# Altium footprint library Airscout_PCB_Lib.PcbLib: 44 footprints (part 1 of 3)
Each footprint in its own frame and in the unit in brackets; x right, y up, seen from the top. Pads: shape width x height; smd on the part's side, far side on the other; paste and mask are expansions set on the pad; w line width, h text height; cw(c..) or ccw(c..) is an arc to the next point about the centre after c.
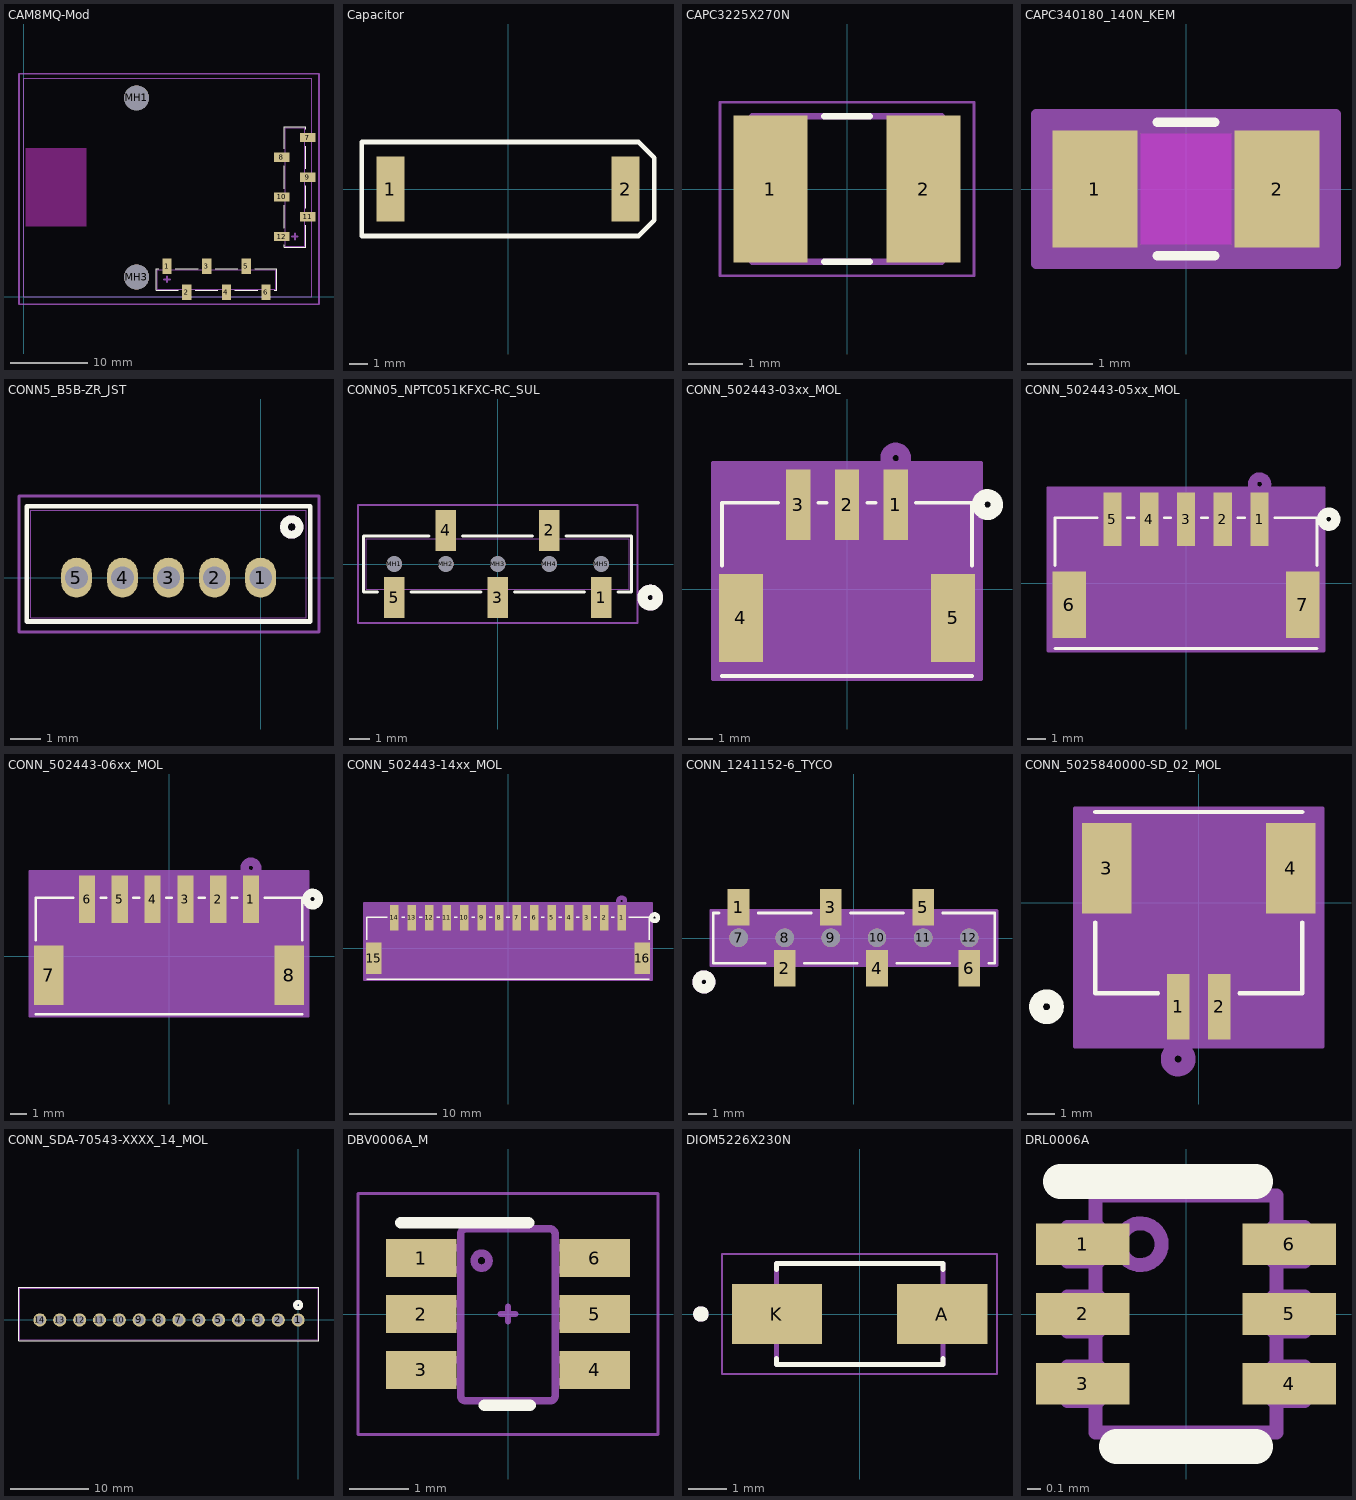
[diagram p0: the footprints below, top view; thin cyan lines are the x and y axes]

## CAM8MQ-Mod [mm] "For SMD Soldering"
pads (14):
  rect 1.2x2 smd paste+0 mask+0.025: 1(18.4,3.876) 2(20.94,0.524) 3(23.48,3.876) 4(26.02,0.524) 5(28.56,3.876) 6(31.1,0.524)
  rect 2x1.2 smd paste+0 mask+0.025: 7(36.476,20.4) 8(33.124,17.86) 9(36.476,15.32) 10(33.124,12.78) 11(36.476,10.24) 12(33.124,7.7)
  round 3.2 hole 3.2 unplated: MH1(14.5,25.5) MH3(14.5,2.5)
Top Layer keep-out:
  region: 0.25,19 8,19 8,9 0.25,9
Top Overlay:
  lines w0.152: 17.318,3.572 17.003,3.572 17.003,0.803 19.858,0.803 ; 19.482,3.572 22.398,3.572 ; 22.022,0.803 24.938,0.803 ; 24.562,3.572 27.478,3.572 ; 27.102,0.803 30.018,0.803 ; 29.642,3.572 32.497,3.572 32.497,0.803 32.182,0.803 ; 33.428,6.618 33.428,6.303 36.197,6.303 36.197,9.158 ; 33.428,8.782 33.428,11.698 ; 33.428,13.862 33.428,16.778 ; 33.428,18.942 33.428,21.797 36.197,21.797 36.197,21.482 ; 36.197,11.322 36.197,14.238 ; 36.197,16.402 36.197,19.318
Mechanical 3:
  text "GPS-Module" at 12.154,14.254 h1.52
Mechanical 7:
  lines w0.254: 18.035,2.2 18.765,2.2 ; 18.4,1.835 18.4,2.565 ; 34.435,7.7 35.165,7.7 ; 34.8,7.335 34.8,8.065
Mechanical 13:
  lines w0.025: 17.13,0.93 17.13,3.445 32.37,3.445 32.37,0.93 17.13,0.93 ; 33.555,6.43 36.07,6.43 36.07,21.67 33.555,21.67 33.555,6.43
  lines w0.1: 32.004,0 37,0 37,21.8 ; 33.3,0 0,0 0,28 37,28 37,21.5
Mechanical 15:
  lines w0.2: -0.6,-1 37.9,-1 37.9,28.6 -0.6,28.6 -0.6,-1
3D body "NPTC061KFXC-RC.STEP": height 7.49, standoff 0, extent 32.793,6.43 37.086,21.67
3D body "NPTC061KFXC-RC.STEP": height 7.49, standoff 0, extent 17.13,-0.086 32.37,4.207

## Capacitor [mm]
pads (2):
  rect 1.5x3.5 smd: 1(-6.35,0) 2(6.35,0)
Top Overlay:
  lines w0.254: -7.89,-2.54 7.043,-2.54 7.89,-1.693 7.89,1.693 7.043,2.54 -7.89,2.54 -7.89,0 -7.89,-2.54

## CAPC3225X270N [mm] "CAP 1210 Imperial"
pads (2):
  rect 1.37x2.72 smd: 1(-1.421,0) 2(1.421,0)
Top Overlay:
  lines w0.127: -0.42,-1.35 0.42,-1.35 ; -0.42,1.35 0.42,1.35
Mechanical 13:
  lines w0.127: -1.75,-1.35 -1.75,1.35 1.75,1.35 1.75,-1.35 -1.75,-1.35
Mechanical 15:
  lines w0.05: -2.355,-1.608 -2.355,1.608 2.355,1.608 2.355,-1.608 -2.355,-1.608
3D body "step_temp.STEP": height 2.7, standoff 0, extent -1.6,-1.25 1.6,1.25

## CAPC340180_140N_KEM [mm] "Caseform: 1206 Imperial; for Caps"
pads (2):
  rect 1.306x1.8 smd paste+0 mask+0: 1(-1.403,0) 2(1.403,0)
Top Layer keep-out:
  region: -0.699,-0.849 -0.699,0.849 0.699,0.849 0.699,-0.849
Top Overlay:
  lines w0.152: -0.442,-1.027 0.442,-1.027 ; -0.442,1.027 0.442,1.027
Mechanical 13:
  lines w0.025: -1.7,-0.9 -1.7,0.9 ; -1.7,-0.9 -0.95,-0.9 -0.95,0.9 -1.7,0.9 ; -1.7,-0.9 1.7,-0.9 ; -1.7,-0.9 -1.7,0.9 ; -1.7,0.9 1.7,0.9 ; 1.7,-0.9 0.95,-0.9 0.95,0.9 1.7,0.9 ; 1.7,-0.9 1.7,0.9 ; 1.7,-0.9 1.7,0.9
Mechanical 15:
  region: 2.31,-1.154 -2.31,-1.154 -2.31,1.154 2.31,1.154
  lines w0.152: -2.31,-1.154 -2.31,1.154 2.31,1.154 2.31,-1.154 -2.31,-1.154
3D body "CAPC340180_140N_KEM.step": height 1.4, standoff 0, extent -1.7,-0.9 1.7,0.9

## CONN5_B5B-ZR_JST [mm]
pads (5):
  oval 1x1.3 hole 0.737 paste-2539.97: 1(0,0) 2(-1.5,0) 3(-3,0) 4(-4.5,0) 5(-6,0)
Top Overlay:
  circle w0.254: c1.016,1.651 r0.254
  lines w0.152: -7.623,-1.432 -7.623,2.327 1.623,2.327 1.623,-1.432 -7.623,-1.432
Bottom Overlay:
  circle w0.254: c1.016,1.651 r0.254
Mechanical 13:
  circle w0.254: c1.016,1.651 r0.254
  lines w0.025: -7.496,-1.305 -7.496,2.2 1.496,2.2 1.496,-1.305 -7.496,-1.305
Mechanical 15:
  lines w0.1: -7.874,-1.778 1.905,-1.778 1.905,2.667 -7.874,2.667 -7.874,-1.778
3D body "B5B-ZR.STEP": height 4.5, standoff -2.7, extent -7.5,-1.242 1.5,2.258

## CONN05_NPTC051KFXC-RC_SUL [mm]
pads (10):
  rect 1x2 smd paste+0 mask+0.025: 1(5.08,-1.65) 2(2.54,1.65) 3(0,-1.65) 4(-2.54,1.65) 5(-5.08,-1.65)
  round 0.762 hole 0.762: MH1(-5.08,0) MH2(-2.54,0) MH3(0,0) MH4(2.54,0) MH5(5.08,0)
Top Overlay:
  circle w0.508: c7.493,-1.651 r0.381
  lines w0.152: -5.908,-1.372 -6.579,-1.372 -6.579,1.372 -3.368,1.372 ; -4.252,-1.372 -0.828,-1.372 ; -1.712,1.372 1.712,1.372 ; 0.828,-1.372 4.252,-1.372 ; 3.368,1.372 6.579,1.372 6.579,-1.372 5.908,-1.372
Bottom Overlay:
  circle w0.508: c7.493,-1.651 r0.381
Mechanical 13:
  circle w0.508: c7.493,-1.651 r0.381
  lines w0.025: -6.452,-1.245 -6.452,1.245 6.452,1.245 6.452,-1.245 -6.452,-1.245
Mechanical 15:
  lines w0.1: -6.858,-2.907 6.858,-2.907 6.858,2.907 -6.858,2.907 -6.858,-2.907
3D body "NPTC051KFXC-RC.STEP": height 7.49, standoff 0, extent -6.35,-2.273 6.35,2.019

## CONN_502443-03xx_MOL [mil]
pads (5):
  rect 39x114 smd paste+0 mask+0: 1(78.74,136.97) 2(0,136.97) 3(-78.74,136.97)
  rect 71x142 smd paste-71 mask-71: 4(-171.26,-46.1) 5(171.26,-46.1)
Top Overlay:
  circle w20: c227,136.97 r15
  lines w6: -202,-140 202,-140 ; -202,38 -202,140 -111.34,140 ; -46.14,140 -32.6,140 ; 32.6,140 46.14,140 ; 111.34,140 202,140 202,38
Bottom Overlay:
  circle w20: c227,136.97 r15
Mechanical 13:
  circle w20: c78.74,211.97 r15
  lines w1: -197,-135 197,-135 197,135 -197,135 -197,-135
Mechanical 15:
  region: 216.76,203.97 -216.76,203.97 -216.76,-145 216.76,-145
  lines w6: -216.76,-145 -216.76,203.97 216.76,203.97 216.76,-145 -216.76,-145
3D body "5024430370.stp": height 296.1, standoff 0.83, extent -196.85,-134.92 196.85,168.23

## CONN_502443-05xx_MOL [mil]
pads (7):
  rect 39x114 smd paste+0 mask+0: 1(157.48,136.97) 2(78.74,136.97) 3(0,136.97) 4(-78.74,136.97) 5(-157.48,136.97)
  rect 71x142 smd paste-71 mask-71: 6(-250,-46.1) 7(250,-46.1)
Top Overlay:
  circle w20: c305.5,136.97 r15
  lines w6: -280.5,-140 280.5,-140 ; -280.5,38 -280.5,140 -190.08,140 ; -124.88,140 -111.34,140 ; -46.14,140 -32.6,140 ; 32.6,140 46.14,140 ; 111.34,140 124.88,140 ; 190.08,140 280.5,140 280.5,38
Bottom Overlay:
  circle w20: c305.5,136.97 r15
Mechanical 13:
  circle w20: c157.48,211.97 r15
  lines w1: -275.5,-135 -275.5,135 275.5,135 275.5,-135 -275.5,-135
Mechanical 15:
  region: 295.5,203.97 -295.5,203.97 -295.5,-145 295.5,-145
  lines w6: -295.5,-145 295.5,-145 295.5,203.97 -295.5,203.97 -295.5,-145
3D body "5024430570.stp": height 296.1, standoff 0.83, extent -275.59,-130 275.59,173.15

## CONN_502443-06xx_MOL [mil]
pads (8):
  rect 39x114 smd paste+0 mask+0: 1(196.85,136.97) 2(118.11,136.97) 3(39.37,136.97) 4(-39.37,136.97) 5(-118.11,136.97) 6(-196.85,136.97)
  rect 71x142 smd paste-71 mask-71: 7(-289.37,-46.1) 8(289.37,-46.1)
Top Overlay:
  circle w20: c345,136.97 r15
  lines w6: -320,-140 320,-140 ; -320,38 -320,140 -229.45,140 ; -164.25,140 -150.71,140 ; -85.51,140 -71.97,140 ; -6.77,140 6.77,140 ; 71.97,140 85.51,140 ; 150.71,140 164.25,140 ; 229.45,140 320,140 320,38
Bottom Overlay:
  circle w20: c345,136.97 r15
Mechanical 13:
  circle w20: c196.85,211.97 r15
  lines w1: -315,-135 -315,135 315,135 315,-135 -315,-135
Mechanical 15:
  region: 334.87,203.97 -334.87,203.97 -334.87,-145 334.87,-145
  lines w6: -334.87,-145 334.87,-145 334.87,203.97 -334.87,203.97 -334.87,-145
3D body "5024430670.stp": height 296.1, standoff 0.83, extent -314.96,-130 314.96,173.15

## CONN_502443-14xx_MOL [mil]
pads (16):
  rect 39x114 smd paste+0 mask+0: 1(511.81,136.97) 2(433.07,136.97) 3(354.33,136.97) 4(275.59,136.97) 5(196.85,136.97) 6(118.11,136.97) 7(39.37,136.97) 8(-39.37,136.97) 9(-118.11,136.97) 10(-196.85,136.97) 11(-275.59,136.97) 12(-354.33,136.97) 13(-433.07,136.97) 14(-511.81,136.97)
  rect 71x142 smd paste-71 mask-71: 15(-604.33,-46.1) 16(604.33,-46.1)
Top Overlay:
  circle w20: c660,136.97 r15
  lines w6: -635,-140 635,-140 ; -635,38 -635,140 -544.41,140 ; -479.21,140 -465.67,140 ; -400.47,140 -386.93,140 ; -321.73,140 -308.19,140 ; -242.99,140 -229.45,140 ; -164.25,140 -150.71,140 ; -85.51,140 -71.97,140 ; -6.77,140 6.77,140 ; 71.97,140 85.51,140 ; 150.71,140 164.25,140 ; 229.45,140 242.99,140 ; 308.19,140 321.73,140 ; 386.93,140 400.47,140 ; 465.67,140 479.21,140 ; 544.41,140 635,140 635,38
Bottom Overlay:
  circle w20: c660,136.97 r15
Mechanical 13:
  circle w20: c511.81,211.97 r15
  lines w1: -630,-135 630,-135 630,135 -630,135 -630,-135
Mechanical 15:
  region: 649.83,203.97 -649.83,203.97 -649.83,-145 649.83,-145
  lines w6: -649.83,-145 -649.83,203.97 649.83,203.97 649.83,-145 -649.83,-145
3D body "5024431470.stp": height 296.1, standoff 0.83, extent -629.92,-139.92 629.92,163.23

## CONN_1241152-6_TYCO [mil]
pads (12):
  rect 47.24x78.74 smd paste+0 mask+1: 1(-250,66.5) 2(-150,-65.5) 3(-50,66.5) 4(50,-65.5) 5(150,66.5) 6(250,-65.5)
  round 40 hole 40 paste-99999 mask+0: 7(-250,0.5) 8(-150,0.5) 9(-50,0.5) 10(50,0.5) 11(150,0.5) 12(250,0.5)
Top Overlay:
  circle w20: c-325,-95 r15
  lines w6: -292.6,54.5 -305,54.5 -305,-54.5 -192.6,-54.5 ; -207.4,54.5 -92.6,54.5 ; -107.4,-54.5 7.4,-54.5 ; -7.4,54.5 107.4,54.5 ; 92.6,-54.5 207.4,-54.5 ; 192.6,54.5 305,54.5 305,-54.5 292.6,-54.5
Bottom Overlay:
  circle w20: c-325,-95 r15
Mechanical 13:
  circle w20: c-325,-95 r15
  lines w1: -300,-49.5 -300,49.5 300,49.5 300,-49.5 -300,-49.5
Mechanical 15:
  region: 310,59.5 -310,59.5 -310,-59.5 310,-59.5
  lines w6: -310,-59.5 310,-59.5 310,59.5 -310,59.5 -310,-59.5
3D body "NPTC061KFXC-RC.STEP": height 295, standoff 0, extent -300,-89.5 300,79.5

## CONN_5025840000-SD_02_MOL [mil]
pads (4):
  rect 32x94 smd paste+0 mask+0: 1(-29.53,-149.41) 2(29.53,-149.41)
  rect 71x130 smd paste-65 mask-65: 3(-131.89,49.41) 4(131.89,49.41)
Top Overlay:
  circle w20: c-218.5,-149.41 r15
  lines w6: -148.5,-28.69 -148.5,-130 -58.63,-130 ; -148.5,130 148.5,130 ; 58.63,-130 148.5,-130 148.5,-28.69
Bottom Overlay:
  circle w20: c-218.5,-149.41 r15
Mechanical 13:
  circle w20: c-29.53,-224.41 r15
  lines w1: -143.5,-125 143.5,-125 143.5,125 -143.5,125 -143.5,-125
Mechanical 15:
  region: 177.39,135 -177.39,135 -177.39,-206.41 177.39,-206.41
  lines w6: -177.39,-206.41 -177.39,135 177.39,135 177.39,-206.41 -177.39,-206.41
3D body "5025840260.stp": height 285.2, standoff -2.2, extent -142.4,-175.2 145,125.2

## CONN_SDA-70543-XXXX_14_MOL [mil] "0705430013"
pads (14):
  round 66 hole 46: 1(0,0) 2(-100,0) 3(-200,0) 4(-300,0) 5(-400,0) 6(-500,0) 7(-600,0) 8(-700,0) 9(-800,0) 10(-900,0) 11(-1000,0) 12(-1100,0) 13(-1200,0) 14(-1300,0)
Top Overlay:
  lines w6: -1405,-105 -1405,165 105,165 105,-105 -1405,-105
  lines w20: -15,74.8 cw(c0,74.8) 15,74.8 cw(c0,74.8) -15,74.8
Mechanical 13:
  lines w6: -1400,-100 -1400,160 100,160 100,-100 -1400,-100
  lines w20: -15,75 cw(c0,75) 15,75 cw(c0,75) -15,75
3D body "705430013.stp": height 450, standoff -145, extent -1400,-100 100,160

## DBV0006A_M [mm]
pads (6):
  rect 1.2x0.65 smd paste+0 mask+0.051: 1(-1.475,0.95) 2(-1.475,0) 3(-1.475,-0.95) 4(1.475,-0.95) 5(1.475,0) 6(1.475,0.95)
Top Overlay:
  lines w0.2: -1.825,1.55 0.35,1.55 ; -0.4,-1.55 0.375,-1.55
Mechanical 13:
  lines w0.127: 0.724,-1.475 ccw(c0.723,-1.399) 0.8,-1.399 0.8,1.37 ccw(c0.723,1.37) 0.724,1.446 ; 0.723,-1.475 -0.724,-1.475 -0.725,-1.475 cw(c-0.724,-1.399) -0.801,-1.399 -0.801,1.37 cw(c-0.724,1.37) -0.725,1.446 -0.724,1.446 0.723,1.446 ; 0.723,-1.475 0.724,-1.475 ; 0.723,1.446 0.724,1.446 ; -1.423,-1.154 -1.423,-0.78 -1.206,-0.78 -1.113,-0.78 -1.081,-0.78 -0.828,-0.78 -0.801,-0.78 -0.801,-1.154 -0.828,-1.154 -1.081,-1.154 -1.113,-1.154 -1.206,-1.154 -1.423,-1.154 ; -1.423,-0.202 -1.423,0.173 -1.206,0.173 -1.113,0.173 -1.081,0.173 -0.828,0.173 -0.801,0.173 -0.801,-0.202 -0.828,-0.202 -1.081,-0.202 -1.113,-0.202 -1.206,-0.202 -1.423,-0.202 ; -1.423,0.751 -1.423,1.125 -1.206,1.125 -1.113,1.125 -1.081,1.125 -0.828,1.125 -0.801,1.125 -0.801,0.751 -0.828,0.751 -1.081,0.751 -1.113,0.751 -1.206,0.751 -1.423,0.751 ; -0.577,0.906 ccw(c-0.45,0.906) -0.323,0.906 ccw(c-0.45,0.906) -0.577,0.906 ; 0.8,-1.154 0.8,-0.78 0.827,-0.78 1.08,-0.78 1.112,-0.78 1.205,-0.78 1.422,-0.78 1.422,-1.154 1.205,-1.154 1.112,-1.154 1.08,-1.154 0.827,-1.154 0.8,-1.154 ; 0.8,-0.202 0.8,0.173 0.827,0.173 1.08,0.173 1.112,0.173 1.205,0.173 1.422,0.173 1.422,-0.202 1.205,-0.202 1.112,-0.202 1.08,-0.202 0.827,-0.202 0.8,-0.202 ; 0.8,0.751 0.8,1.125 0.827,1.125 1.08,1.125 1.112,1.125 1.205,1.125 1.422,1.125 1.422,0.751 1.205,0.751 1.112,0.751 1.08,0.751 0.827,0.751 0.8,0.751
Mechanical 15:
  lines w0.05: -2.55,-2.05 -2.55,2.05 2.55,2.05 2.55,-2.05 -2.55,-2.05
  lines w0.1: -0.127,0 0.127,0 ; 0,-0.127 0,0.127
3D body "DBV0006A.stp": height 1.2, standoff 0, extent -1.4,-1.45 1.4,1.45

## DIOM5226X230N [mm]
height 2.3
pads (2):
  rect 2.33x1.55 smd: A(2.135,0) K(-2.135,0)
Top Overlay:
  circle w0.2: c-4.1,0 r0.1
  lines w0.127: -2.15,-1.15 -2.15,-1.302 2.15,-1.302 2.15,-1.15 ; -2.15,1.15 -2.15,1.302 2.15,1.302 2.15,1.15
Mechanical 13:
  circle w0.2: c-4.1,0 r0.1
  lines w0.127: -2.15,-1.302 -2.15,1.302 2.15,1.302 2.15,-1.302 -2.15,-1.302
Mechanical 15:
  lines w0.05: -3.55,-1.552 -3.55,1.552 3.55,1.552 3.55,-1.552 -3.55,-1.552
3D body "step_temp.STEP": height 2.4, standoff 0, extent -2.598,-1.302 2.598,1.302

## DRL0006A [mm]
pads (6):
  rect 0.67x0.3 smd paste+0 mask+0: 1(-0.74,0.5) 2(-0.74,0) 3(-0.74,-0.5) 4(0.74,-0.5) 5(0.74,0) 6(0.74,0.5)
Top Overlay:
  lines w0.25: -0.9,0.95 0.5,0.95 ; -0.5,-0.95 0.5,-0.95
Mechanical 13:
  circle w0.1: c-0.325,0.5 r0.15
  lines w0.1: -0.65,-0.625 -0.65,-0.85 0.65,-0.85 0.65,-0.625 ; -0.65,-0.375 -0.65,-0.125 ; -0.65,0.125 -0.65,0.375 ; -0.65,0.625 -0.65,0.85 0.65,0.85 0.65,0.625 ; 0.65,-0.375 0.65,0.375 ; -0.85,-0.625 -0.627,-0.625 -0.627,-0.375 -0.85,-0.375 -0.85,-0.625 ; -0.85,-0.125 -0.85,0.125 -0.627,0.125 -0.627,-0.125 -0.85,-0.125 ; -0.85,0.375 -0.627,0.375 -0.627,0.625 -0.85,0.625 -0.85,0.375 ; 0.627,-0.625 0.85,-0.625 0.85,-0.375 0.627,-0.375 0.627,-0.625 ; 0.627,-0.125 0.627,0.125 0.85,0.125 0.85,-0.125 0.627,-0.125 ; 0.627,0.375 0.85,0.375 0.85,0.625 0.627,0.625 0.627,0.375
3D body "DRL0006A.stp": height 0.6, standoff 0, extent -0.8,-0.783 0.8,0.783